# Altium integrated library Samtec_2_mm_Pitch_Socket_Strips.IntLib: 251 symbols (part 1 of 3)
Pins are listed as number, name and electrical type; pins without a type are passive.

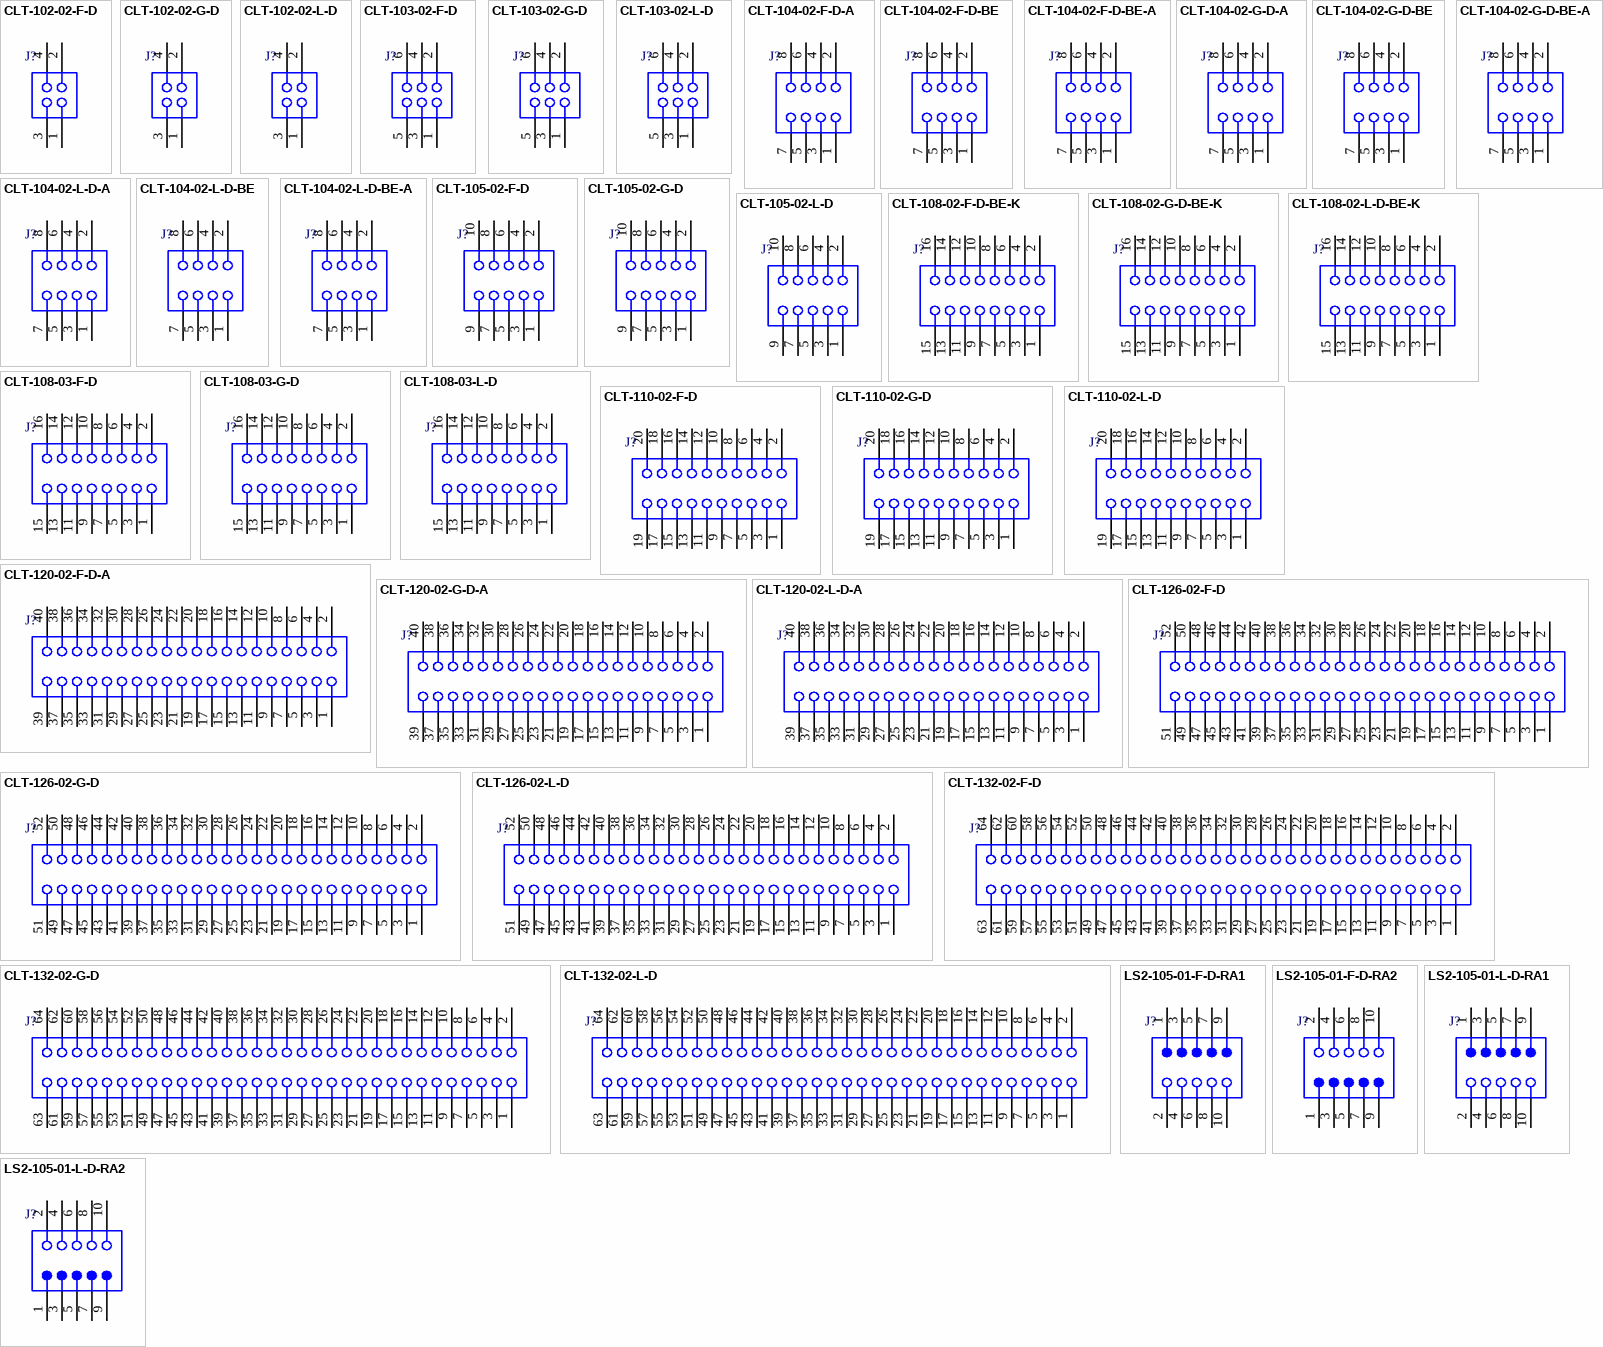
[diagram p0: symbols CLT-102-02-F-D to LS2-105-01-L-D-RA2]

## CLT-102-02-F-D
designator J?
Low Profile Dual Wipe Socket, Surface Mount, Vertical, -55 to 125 degC, 2 mm Pitch, 4-Pin, Female, RoHS; Manufacturer: Samtec; PartNumber: CLT-102-02-F-D; Pitch: 2 mm; DatasheetVersion: F-214; PackageVersion: CA, 10/1994; PackageReference: CLT-102-02-X-D; PackageDescription: 2mm Low Profile Socket Strip; Supplier 1: Newark; Supplier Part Number 1: 87P9552; Orientation: Vertical; RoHS: True; Temperature Range: -55 to 125 degC; Mounting Technology: Surface Mount; ComponentLink1Description: Manufacturer URL; ComponentLink1URL: http://www.samtec.com; ComponentLink2Description: Datasheet; ComponentLink2URL: http://www.samtec.com/documents/webfiles/pdf/CLT.PDF; ComponentLink3Description: Package Specification; ComponentLink3URL: http://www.samtec.com/documents/webfiles/cpdf/CLT-1XX-02-XX-D-XX-MKT.pdf
footprint SMTC-CLT-102-02-X-D (Low Profile Socket Strip, 2x2 Pins, Vertical, 2mm Pitch, Female)
pins: 1, 2, 3, 4

## CLT-102-02-G-D
designator J?
Low Profile Dual Wipe Socket, Surface Mount, Vertical, -55 to 125 degC, 2 mm Pitch, 4-Pin, Female, RoHS; Manufacturer: Samtec; PartNumber: CLT-102-02-G-D; Pitch: 2 mm; DatasheetVersion: F-214; PackageVersion: CA, 10/1994; PackageReference: CLT-102-02-X-D; PackageDescription: 2mm Low Profile Socket Strip; Supplier 1: Digi-Key; Supplier Part Number 1: SAM1165-02-ND; Orientation: Vertical; RoHS: True; Temperature Range: -55 to 125 degC; Mounting Technology: Surface Mount; ComponentLink1Description: Manufacturer URL; ComponentLink1URL: http://www.samtec.com; ComponentLink2Description: Datasheet; ComponentLink2URL: http://www.samtec.com/documents/webfiles/pdf/CLT.PDF; ComponentLink3Description: Package Specification; ComponentLink3URL: http://www.samtec.com/documents/webfiles/cpdf/CLT-1XX-02-XX-D-XX-MKT.pdf
footprint SMTC-CLT-102-02-X-D (Low Profile Socket Strip, 2x2 Pins, Vertical, 2mm Pitch, Female)
pins: 1, 2, 3, 4

## CLT-102-02-L-D
designator J?
Low Profile Dual Wipe Socket, Surface Mount, Vertical, -55 to 125 degC, 2 mm Pitch, 4-Pin, Female, RoHS; Manufacturer: Samtec; PartNumber: CLT-102-02-L-D; Pitch: 2 mm; DatasheetVersion: F-214; PackageVersion: CA, 10/1994; PackageReference: CLT-102-02-X-D; PackageDescription: 2mm Low Profile Socket Strip; Supplier 1: Digi-Key; Supplier Part Number 1: SAM1166-02-ND; Supplier 2: Newark; Supplier Part Number 2: 11P3945; Orientation: Vertical; RoHS: True; Temperature Range: -55 to 125 degC; Mounting Technology: Surface Mount; ComponentLink1Description: Manufacturer URL; ComponentLink1URL: http://www.samtec.com; ComponentLink2Description: Datasheet; ComponentLink2URL: http://www.samtec.com/documents/webfiles/pdf/CLT.PDF; ComponentLink3Description: Package Specification; ComponentLink3URL: http://www.samtec.com/documents/webfiles/cpdf/CLT-1XX-02-XX-D-XX-MKT.pdf
footprint SMTC-CLT-102-02-X-D (Low Profile Socket Strip, 2x2 Pins, Vertical, 2mm Pitch, Female)
pins: 1, 2, 3, 4

## CLT-103-02-F-D
designator J?
Low Profile Dual Wipe Socket, Surface Mount, Vertical, -55 to 125 degC, 2 mm Pitch, 6-Pin, Female, RoHS; Manufacturer: Samtec; PartNumber: CLT-103-02-F-D; Pitch: 2 mm; DatasheetVersion: F-214; PackageVersion: CA, 10/1994; PackageReference: CLT-103-02-X-D; PackageDescription: 2mm Low Profile Socket Strip; Supplier 1: Newark; Supplier Part Number 1: 87P9581; Orientation: Vertical; RoHS: True; Temperature Range: -55 to 125 degC; Mounting Technology: Surface Mount; ComponentLink1Description: Manufacturer URL; ComponentLink1URL: http://www.samtec.com; ComponentLink2Description: Datasheet; ComponentLink2URL: http://www.samtec.com/documents/webfiles/pdf/CLT.PDF; ComponentLink3Description: Package Specification; ComponentLink3URL: http://www.samtec.com/documents/webfiles/cpdf/CLT-1XX-02-XX-D-XX-MKT.pdf
footprint SMTC-CLT-103-02-X-D (Low Profile Socket Strip, 2x3 Pins, Vertical, 2mm Pitch, Female)
pins: 1, 2, 3, 4, 5, 6

## CLT-103-02-G-D
designator J?
Low Profile Dual Wipe Socket, Surface Mount, Vertical, -55 to 125 degC, 2 mm Pitch, 6-Pin, Female, RoHS; Manufacturer: Samtec; PartNumber: CLT-103-02-G-D; Pitch: 2 mm; DatasheetVersion: F-214; PackageVersion: CA, 10/1994; PackageReference: CLT-103-02-X-D; PackageDescription: 2mm Low Profile Socket Strip; Supplier 1: Digi-Key; Supplier Part Number 1: SAM1165-03-ND; Supplier 2: Newark; Supplier Part Number 2: 11P3948; Orientation: Vertical; RoHS: True; Temperature Range: -55 to 125 degC; Mounting Technology: Surface Mount; ComponentLink1Description: Manufacturer URL; ComponentLink1URL: http://www.samtec.com; ComponentLink2Description: Datasheet; ComponentLink2URL: http://www.samtec.com/documents/webfiles/pdf/CLT.PDF; ComponentLink3Description: Package Specification; ComponentLink3URL: http://www.samtec.com/documents/webfiles/cpdf/CLT-1XX-02-XX-D-XX-MKT.pdf
footprint SMTC-CLT-103-02-X-D (Low Profile Socket Strip, 2x3 Pins, Vertical, 2mm Pitch, Female)
pins: 1, 2, 3, 4, 5, 6

## CLT-103-02-L-D
designator J?
Low Profile Dual Wipe Socket, Surface Mount, Vertical, -55 to 125 degC, 2 mm Pitch, 6-Pin, Female, RoHS; Manufacturer: Samtec; PartNumber: CLT-103-02-L-D; Pitch: 2 mm; DatasheetVersion: F-214; PackageVersion: CA, 10/1994; PackageReference: CLT-103-02-X-D; PackageDescription: 2mm Low Profile Socket Strip; Supplier 1: Digi-Key; Supplier Part Number 1: SAM1166-03-ND; Supplier 2: Newark; Supplier Part Number 2: 11P3949; Orientation: Vertical; RoHS: True; Temperature Range: -55 to 125 degC; Mounting Technology: Surface Mount; ComponentLink1Description: Manufacturer URL; ComponentLink1URL: http://www.samtec.com; ComponentLink2Description: Datasheet; ComponentLink2URL: http://www.samtec.com/documents/webfiles/pdf/CLT.PDF; ComponentLink3Description: Package Specification; ComponentLink3URL: http://www.samtec.com/documents/webfiles/cpdf/CLT-1XX-02-XX-D-XX-MKT.pdf
footprint SMTC-CLT-103-02-X-D (Low Profile Socket Strip, 2x3 Pins, Vertical, 2mm Pitch, Female)
pins: 1, 2, 3, 4, 5, 6

## CLT-104-02-F-D-A
designator J?
Low Profile Dual Wipe Socket, Surface Mount, Vertical, -55 to 125 degC, 2 mm Pitch, 8-Pin, Female, RoHS; Manufacturer: Samtec; PartNumber: CLT-104-02-F-D-A; Pitch: 2 mm; DatasheetVersion: F-214; PackageVersion: CA, 10/1994; PackageReference: CLT-104-02-X-D-A; PackageDescription: 2mm Low Profile Socket Strip; Supplier 1: Newark; Supplier Part Number 1: 87P9633; Orientation: Vertical; RoHS: True; Temperature Range: -55 to 125 degC; Mounting Technology: Surface Mount; ComponentLink1Description: Manufacturer URL; ComponentLink1URL: http://www.samtec.com; ComponentLink2Description: Datasheet; ComponentLink2URL: http://www.samtec.com/documents/webfiles/pdf/CLT.PDF; ComponentLink3Description: Package Specification; ComponentLink3URL: http://www.samtec.com/documents/webfiles/cpdf/CLT-1XX-02-XX-D-XX-MKT.pdf
footprint SMTC-CLT-104-02-X-D-A (Low Profile Socket Strip, 2x4 Pins, Vertical, 2mm Pitch, Female)
pins: 1, 2, 3, 4, 5, 6, 7, 8

## CLT-104-02-F-D-BE
designator J?
Low Profile Dual Wipe Socket, Surface Mount, Vertical, -55 to 125 degC, 2 mm Pitch, 8-Pin, Female, RoHS; Manufacturer: Samtec; PartNumber: CLT-104-02-F-D-BE; Pitch: 2 mm; DatasheetVersion: F-214; PackageVersion: CA, 10/1994; PackageReference: CLT-104-02-X-D-BE; PackageDescription: 2mm Low Profile Socket Strip; Supplier 1: Newark; Supplier Part Number 1: 87P9639; Orientation: Vertical; RoHS: True; Temperature Range: -55 to 125 degC; Mounting Technology: Surface Mount; ComponentLink1Description: Manufacturer URL; ComponentLink1URL: http://www.samtec.com; ComponentLink2Description: Datasheet; ComponentLink2URL: http://www.samtec.com/documents/webfiles/pdf/CLT.PDF; ComponentLink3Description: Package Specification; ComponentLink3URL: http://www.samtec.com/documents/webfiles/cpdf/CLT-1XX-02-XX-D-XX-MKT.pdf
footprint SMTC-CLT-104-02-X-D-BE (Low Profile Socket Strip, 2x4 Pins, Vertical, 2mm Pitch, Female)
pins: 1, 2, 3, 4, 5, 6, 7, 8

## CLT-104-02-F-D-BE-A
designator J?
Low Profile Dual Wipe Socket, Surface Mount, Vertical, -55 to 125 degC, 2 mm Pitch, 8-Pin, Female, RoHS; Manufacturer: Samtec; PartNumber: CLT-104-02-F-D-BE-A; Pitch: 2 mm; DatasheetVersion: F-214; PackageVersion: CA, 10/1994; PackageReference: CLT-104-02-X-D-BE-A; PackageDescription: 2mm Low Profile Socket Strip; Orientation: Vertical; RoHS: True; Temperature Range: -55 to 125 degC; Mounting Technology: Surface Mount; ComponentLink1Description: Manufacturer URL; ComponentLink1URL: http://www.samtec.com; ComponentLink2Description: Datasheet; ComponentLink2URL: http://www.samtec.com/documents/webfiles/pdf/CLT.PDF; ComponentLink3Description: Package Specification; ComponentLink3URL: http://www.samtec.com/documents/webfiles/cpdf/CLT-1XX-02-XX-D-XX-MKT.pdf
footprint SMTC-CLT-104-02-X-D-BE-A (Low Profile Socket Strip, 2x4 Pins, Vertical, 2mm Pitch, Female)
pins: 1, 2, 3, 4, 5, 6, 7, 8

## CLT-104-02-G-D-A
designator J?
Low Profile Dual Wipe Socket, Surface Mount, Vertical, -55 to 125 degC, 2 mm Pitch, 8-Pin, Female, RoHS; Manufacturer: Samtec; PartNumber: CLT-104-02-G-D-A; Pitch: 2 mm; DatasheetVersion: F-214; PackageVersion: CA, 10/1994; PackageReference: CLT-104-02-X-D-A; PackageDescription: 2mm Low Profile Socket Strip; Orientation: Vertical; RoHS: True; Temperature Range: -55 to 125 degC; Mounting Technology: Surface Mount; ComponentLink1Description: Manufacturer URL; ComponentLink1URL: http://www.samtec.com; ComponentLink2Description: Datasheet; ComponentLink2URL: http://www.samtec.com/documents/webfiles/pdf/CLT.PDF; ComponentLink3Description: Package Specification; ComponentLink3URL: http://www.samtec.com/documents/webfiles/cpdf/CLT-1XX-02-XX-D-XX-MKT.pdf
footprint SMTC-CLT-104-02-X-D-A (Low Profile Socket Strip, 2x4 Pins, Vertical, 2mm Pitch, Female)
pins: 1, 2, 3, 4, 5, 6, 7, 8

## CLT-104-02-G-D-BE
designator J?
Low Profile Dual Wipe Socket, Surface Mount, Vertical, -55 to 125 degC, 2 mm Pitch, 8-Pin, Female, RoHS; Manufacturer: Samtec; PartNumber: CLT-104-02-G-D-BE; Pitch: 2 mm; DatasheetVersion: F-214; PackageVersion: CA, 10/1994; PackageReference: CLT-104-02-X-D-BE; PackageDescription: 2mm Low Profile Socket Strip; Supplier 1: Newark; Supplier Part Number 1: 87P9679; Orientation: Vertical; RoHS: True; Temperature Range: -55 to 125 degC; Mounting Technology: Surface Mount; ComponentLink1Description: Manufacturer URL; ComponentLink1URL: http://www.samtec.com; ComponentLink2Description: Datasheet; ComponentLink2URL: http://www.samtec.com/documents/webfiles/pdf/CLT.PDF; ComponentLink3Description: Package Specification; ComponentLink3URL: http://www.samtec.com/documents/webfiles/cpdf/CLT-1XX-02-XX-D-XX-MKT.pdf
footprint SMTC-CLT-104-02-X-D-BE (Low Profile Socket Strip, 2x4 Pins, Vertical, 2mm Pitch, Female)
pins: 1, 2, 3, 4, 5, 6, 7, 8

## CLT-104-02-G-D-BE-A
designator J?
Low Profile Dual Wipe Socket, Surface Mount, Vertical, -55 to 125 degC, 2 mm Pitch, 8-Pin, Female, RoHS; Manufacturer: Samtec; PartNumber: CLT-104-02-G-D-BE-A; Pitch: 2 mm; DatasheetVersion: F-214; PackageVersion: CA, 10/1994; PackageReference: CLT-104-02-X-D-BE-A; PackageDescription: 2mm Low Profile Socket Strip; Orientation: Vertical; RoHS: True; Temperature Range: -55 to 125 degC; Mounting Technology: Surface Mount; ComponentLink1Description: Manufacturer URL; ComponentLink1URL: http://www.samtec.com; ComponentLink2Description: Datasheet; ComponentLink2URL: http://www.samtec.com/documents/webfiles/pdf/CLT.PDF; ComponentLink3Description: Package Specification; ComponentLink3URL: http://www.samtec.com/documents/webfiles/cpdf/CLT-1XX-02-XX-D-XX-MKT.pdf
footprint SMTC-CLT-104-02-X-D-BE-A (Low Profile Socket Strip, 2x4 Pins, Vertical, 2mm Pitch, Female)
pins: 1, 2, 3, 4, 5, 6, 7, 8

## CLT-104-02-L-D-A
designator J?
Low Profile Dual Wipe Socket, Surface Mount, Vertical, -55 to 125 degC, 2 mm Pitch, 8-Pin, Female, RoHS; Manufacturer: Samtec; PartNumber: CLT-104-02-L-D-A; Pitch: 2 mm; DatasheetVersion: F-214; PackageVersion: CA, 10/1994; PackageReference: CLT-104-02-X-D-A; PackageDescription: 2mm Low Profile Socket Strip; Supplier 1: Newark; Supplier Part Number 1: 87P9698; Orientation: Vertical; RoHS: True; Temperature Range: -55 to 125 degC; Mounting Technology: Surface Mount; ComponentLink1Description: Manufacturer URL; ComponentLink1URL: http://www.samtec.com; ComponentLink2Description: Datasheet; ComponentLink2URL: http://www.samtec.com/documents/webfiles/pdf/CLT.PDF; ComponentLink3Description: Package Specification; ComponentLink3URL: http://www.samtec.com/documents/webfiles/cpdf/CLT-1XX-02-XX-D-XX-MKT.pdf
footprint SMTC-CLT-104-02-X-D-A (Low Profile Socket Strip, 2x4 Pins, Vertical, 2mm Pitch, Female)
pins: 1, 2, 3, 4, 5, 6, 7, 8

## CLT-104-02-L-D-BE
designator J?
Low Profile Dual Wipe Socket, Surface Mount, Vertical, -55 to 125 degC, 2 mm Pitch, 8-Pin, Female, RoHS; Manufacturer: Samtec; PartNumber: CLT-104-02-L-D-BE; Pitch: 2 mm; DatasheetVersion: F-214; PackageVersion: CA, 10/1994; PackageReference: CLT-104-02-X-D-BE; PackageDescription: 2mm Low Profile Socket Strip; Supplier 1: Newark; Supplier Part Number 1: 87P9705; Orientation: Vertical; RoHS: True; Temperature Range: -55 to 125 degC; Mounting Technology: Surface Mount; ComponentLink1Description: Manufacturer URL; ComponentLink1URL: http://www.samtec.com; ComponentLink2Description: Datasheet; ComponentLink2URL: http://www.samtec.com/documents/webfiles/pdf/CLT.PDF; ComponentLink3Description: Package Specification; ComponentLink3URL: http://www.samtec.com/documents/webfiles/cpdf/CLT-1XX-02-XX-D-XX-MKT.pdf
footprint SMTC-CLT-104-02-X-D-BE (Low Profile Socket Strip, 2x4 Pins, Vertical, 2mm Pitch, Female)
pins: 1, 2, 3, 4, 5, 6, 7, 8

## CLT-104-02-L-D-BE-A
designator J?
Low Profile Dual Wipe Socket, Surface Mount, Vertical, -55 to 125 degC, 2 mm Pitch, 8-Pin, Female, RoHS; Manufacturer: Samtec; PartNumber: CLT-104-02-L-D-BE-A; Pitch: 2 mm; DatasheetVersion: F-214; PackageVersion: CA, 10/1994; PackageReference: CLT-104-02-X-D-BE-A; PackageDescription: 2mm Low Profile Socket Strip; Orientation: Vertical; RoHS: True; Temperature Range: -55 to 125 degC; Mounting Technology: Surface Mount; ComponentLink1Description: Manufacturer URL; ComponentLink1URL: http://www.samtec.com; ComponentLink2Description: Datasheet; ComponentLink2URL: http://www.samtec.com/documents/webfiles/pdf/CLT.PDF; ComponentLink3Description: Package Specification; ComponentLink3URL: http://www.samtec.com/documents/webfiles/cpdf/CLT-1XX-02-XX-D-XX-MKT.pdf
footprint SMTC-CLT-104-02-X-D-BE-A (Low Profile Socket Strip, 2x4 Pins, Vertical, 2mm Pitch, Female)
pins: 1, 2, 3, 4, 5, 6, 7, 8

## CLT-105-02-F-D
designator J?
Low Profile Dual Wipe Socket, Surface Mount, Vertical, -55 to 125 degC, 2 mm Pitch, 10-Pin, Female, RoHS; Manufacturer: Samtec; PartNumber: CLT-105-02-F-D; Pitch: 2 mm; DatasheetVersion: F-214; PackageVersion: CA, 10/1994; PackageReference: CLT-105-02-X-D; PackageDescription: 2mm Low Profile Socket Strip; Supplier 1: Newark; Supplier Part Number 1: 87P9758; Orientation: Vertical; RoHS: True; Temperature Range: -55 to 125 degC; Mounting Technology: Surface Mount; ComponentLink1Description: Manufacturer URL; ComponentLink1URL: http://www.samtec.com; ComponentLink2Description: Datasheet; ComponentLink2URL: http://www.samtec.com/documents/webfiles/pdf/CLT.PDF; ComponentLink3Description: Package Specification; ComponentLink3URL: http://www.samtec.com/documents/webfiles/cpdf/CLT-1XX-02-XX-D-XX-MKT.pdf
footprint SMTC-CLT-105-02-X-D (Low Profile Socket Strip, 2x5 Pins, Vertical, 2mm Pitch, Female)
pins: 1, 2, 3, 4, 5, 6, 7, 8, 9, 10

## CLT-105-02-G-D
designator J?
Low Profile Dual Wipe Socket, Surface Mount, Vertical, -55 to 125 degC, 2 mm Pitch, 10-Pin, Female, RoHS; Manufacturer: Samtec; PartNumber: CLT-105-02-G-D; Pitch: 2 mm; DatasheetVersion: F-214; PackageVersion: CA, 10/1994; PackageReference: CLT-105-02-X-D; PackageDescription: 2mm Low Profile Socket Strip; Supplier 1: Digi-Key; Supplier Part Number 1: SAM1165-05-ND; Supplier 2: Newark; Supplier Part Number 2: 11P3956; Orientation: Vertical; RoHS: True; Temperature Range: -55 to 125 degC; Mounting Technology: Surface Mount; ComponentLink1Description: Manufacturer URL; ComponentLink1URL: http://www.samtec.com; ComponentLink2Description: Datasheet; ComponentLink2URL: http://www.samtec.com/documents/webfiles/pdf/CLT.PDF; ComponentLink3Description: Package Specification; ComponentLink3URL: http://www.samtec.com/documents/webfiles/cpdf/CLT-1XX-02-XX-D-XX-MKT.pdf
footprint SMTC-CLT-105-02-X-D (Low Profile Socket Strip, 2x5 Pins, Vertical, 2mm Pitch, Female)
pins: 1, 2, 3, 4, 5, 6, 7, 8, 9, 10

## CLT-105-02-L-D
designator J?
Low Profile Dual Wipe Socket, Surface Mount, Vertical, -55 to 125 degC, 2 mm Pitch, 10-Pin, Female, RoHS; Manufacturer: Samtec; PartNumber: CLT-105-02-L-D; Pitch: 2 mm; DatasheetVersion: F-214; PackageVersion: CA, 10/1994; PackageReference: CLT-105-02-X-D; PackageDescription: 2mm Low Profile Socket Strip; Supplier 1: Digi-Key; Supplier Part Number 1: SAM1166-05-ND; Supplier 2: Farnell; Supplier Part Number 2: 1667571; Supplier 3: Newark; Supplier Part Number 3: 15P1351; Supplier 4: Newark; Supplier Part Number 4: 11P3957; Orientation: Vertical; RoHS: True; Temperature Range: -55 to 125 degC; Mounting Technology: Surface Mount; ComponentLink1Description: Manufacturer URL; ComponentLink1URL: http://www.samtec.com; ComponentLink2Description: Datasheet; ComponentLink2URL: http://www.samtec.com/documents/webfiles/pdf/CLT.PDF; ComponentLink3Description: Package Specification; ComponentLink3URL: http://www.samtec.com/documents/webfiles/cpdf/CLT-1XX-02-XX-D-XX-MKT.pdf
footprint SMTC-CLT-105-02-X-D (Low Profile Socket Strip, 2x5 Pins, Vertical, 2mm Pitch, Female)
pins: 1, 2, 3, 4, 5, 6, 7, 8, 9, 10

## CLT-108-02-F-D-BE-K
designator J?
Low Profile Dual Wipe Socket, Surface Mount, Vertical, -55 to 125 degC, 2 mm Pitch, 16-Pin, Female, RoHS; Manufacturer: Samtec; PartNumber: CLT-108-02-F-D-BE-K; Pitch: 2 mm; DatasheetVersion: F-214; PackageVersion: CA, 10/1994; PackageReference: CLT-108-02-X-D-BE-K; PackageDescription: 2mm Low Profile Socket Strip; Orientation: Vertical; RoHS: True; Temperature Range: -55 to 125 degC; Mounting Technology: Surface Mount; ComponentLink1Description: Manufacturer URL; ComponentLink1URL: http://www.samtec.com; ComponentLink2Description: Datasheet; ComponentLink2URL: http://www.samtec.com/documents/webfiles/pdf/CLT.PDF; ComponentLink3Description: Package Specification; ComponentLink3URL: http://www.samtec.com/documents/webfiles/cpdf/CLT-1XX-02-XX-D-XX-MKT.pdf
footprint SMTC-CLT-108-02-X-D-BE-K (Low Profile Socket Strip, 2x8 Pins, Vertical, 2mm Pitch, Female)
pins: 1, 2, 3, 4, 5, 6, 7, 8, 9, 10, 11, 12, 13, 14, 15, 16

## CLT-108-02-G-D-BE-K
designator J?
Low Profile Dual Wipe Socket, Surface Mount, Vertical, -55 to 125 degC, 2 mm Pitch, 16-Pin, Female, RoHS; Manufacturer: Samtec; PartNumber: CLT-108-02-G-D-BE-K; Pitch: 2 mm; DatasheetVersion: F-214; PackageVersion: CA, 10/1994; PackageReference: CLT-108-02-X-D-BE-K; PackageDescription: 2mm Low Profile Socket Strip; Orientation: Vertical; RoHS: True; Temperature Range: -55 to 125 degC; Mounting Technology: Surface Mount; ComponentLink1Description: Manufacturer URL; ComponentLink1URL: http://www.samtec.com; ComponentLink2Description: Datasheet; ComponentLink2URL: http://www.samtec.com/documents/webfiles/pdf/CLT.PDF; ComponentLink3Description: Package Specification; ComponentLink3URL: http://www.samtec.com/documents/webfiles/cpdf/CLT-1XX-02-XX-D-XX-MKT.pdf
footprint SMTC-CLT-108-02-X-D-BE-K (Low Profile Socket Strip, 2x8 Pins, Vertical, 2mm Pitch, Female)
pins: 1, 2, 3, 4, 5, 6, 7, 8, 9, 10, 11, 12, 13, 14, 15, 16

## CLT-108-02-L-D-BE-K
designator J?
Low Profile Dual Wipe Socket, Surface Mount, Vertical, -55 to 125 degC, 2 mm Pitch, 16-Pin, Female, RoHS; Manufacturer: Samtec; PartNumber: CLT-108-02-L-D-BE-K; Pitch: 2 mm; DatasheetVersion: F-214; PackageVersion: CA, 10/1994; PackageReference: CLT-108-02-X-D-BE-K; PackageDescription: 2mm Low Profile Socket Strip; Orientation: Vertical; RoHS: True; Temperature Range: -55 to 125 degC; Mounting Technology: Surface Mount; ComponentLink1Description: Manufacturer URL; ComponentLink1URL: http://www.samtec.com; ComponentLink2Description: Datasheet; ComponentLink2URL: http://www.samtec.com/documents/webfiles/pdf/CLT.PDF; ComponentLink3Description: Package Specification; ComponentLink3URL: http://www.samtec.com/documents/webfiles/cpdf/CLT-1XX-02-XX-D-XX-MKT.pdf
footprint SMTC-CLT-108-02-X-D-BE-K (Low Profile Socket Strip, 2x8 Pins, Vertical, 2mm Pitch, Female)
pins: 1, 2, 3, 4, 5, 6, 7, 8, 9, 10, 11, 12, 13, 14, 15, 16

## CLT-108-03-F-D
designator J?
Low Profile Dual Wipe Socket, Through-hole, Vertical, -55 to 125 degC, 2 mm Pitch, 16-Pin, Female, RoHS; Manufacturer: Samtec; PartNumber: CLT-108-03-F-D; Pitch: 2 mm; DatasheetVersion: F-214; PackageVersion: X, 11/1995; PackageReference: CLT-108-03-X-D; PackageDescription: 2mm Low Profile Socket Strip; Orientation: Vertical; RoHS: True; Temperature Range: -55 to 125 degC; Mounting Technology: Through-hole; ComponentLink1Description: Manufacturer URL; ComponentLink1URL: http://www.samtec.com; ComponentLink2Description: Datasheet; ComponentLink2URL: http://www.samtec.com/documents/webfiles/pdf/CLT.PDF; ComponentLink3Description: Package Specification; ComponentLink3URL: http://www.samtec.com/documents/webfiles/cpdf/CLT-1XX-XX-XX-D-MKT.pdf
footprint SMTC-CLT-108-03-X-D (Low Profile Socket Strip, 2x8 Pins, Vertical, 2mm Pitch, Female)
pins: 1, 2, 3, 4, 5, 6, 7, 8, 9, 10, 11, 12, 13, 14, 15, 16

## CLT-108-03-G-D
designator J?
Low Profile Dual Wipe Socket, Through-hole, Vertical, -55 to 125 degC, 2 mm Pitch, 16-Pin, Female, RoHS; Manufacturer: Samtec; PartNumber: CLT-108-03-G-D; Pitch: 2 mm; DatasheetVersion: F-214; PackageVersion: X, 11/1995; PackageReference: CLT-108-03-X-D; PackageDescription: 2mm Low Profile Socket Strip; Orientation: Vertical; RoHS: True; Temperature Range: -55 to 125 degC; Mounting Technology: Through-hole; ComponentLink1Description: Manufacturer URL; ComponentLink1URL: http://www.samtec.com; ComponentLink2Description: Datasheet; ComponentLink2URL: http://www.samtec.com/documents/webfiles/pdf/CLT.PDF; ComponentLink3Description: Package Specification; ComponentLink3URL: http://www.samtec.com/documents/webfiles/cpdf/CLT-1XX-XX-XX-D-MKT.pdf
footprint SMTC-CLT-108-03-X-D (Low Profile Socket Strip, 2x8 Pins, Vertical, 2mm Pitch, Female)
pins: 1, 2, 3, 4, 5, 6, 7, 8, 9, 10, 11, 12, 13, 14, 15, 16

## CLT-108-03-L-D
designator J?
Low Profile Dual Wipe Socket, Through-hole, Vertical, -55 to 125 degC, 2 mm Pitch, 16-Pin, Female, RoHS; Manufacturer: Samtec; PartNumber: CLT-108-03-L-D; Pitch: 2 mm; DatasheetVersion: F-214; PackageVersion: X, 11/1995; PackageReference: CLT-108-03-X-D; PackageDescription: 2mm Low Profile Socket Strip; Orientation: Vertical; RoHS: True; Temperature Range: -55 to 125 degC; Mounting Technology: Through-hole; ComponentLink1Description: Manufacturer URL; ComponentLink1URL: http://www.samtec.com; ComponentLink2Description: Datasheet; ComponentLink2URL: http://www.samtec.com/documents/webfiles/pdf/CLT.PDF; ComponentLink3Description: Package Specification; ComponentLink3URL: http://www.samtec.com/documents/webfiles/cpdf/CLT-1XX-XX-XX-D-MKT.pdf
footprint SMTC-CLT-108-03-X-D (Low Profile Socket Strip, 2x8 Pins, Vertical, 2mm Pitch, Female)
pins: 1, 2, 3, 4, 5, 6, 7, 8, 9, 10, 11, 12, 13, 14, 15, 16

## CLT-110-02-F-D
designator J?
Low Profile Dual Wipe Socket, Surface Mount, Vertical, -55 to 125 degC, 2 mm Pitch, 20-Pin, Female, RoHS; Manufacturer: Samtec; PartNumber: CLT-110-02-F-D; Pitch: 2 mm; DatasheetVersion: F-214; PackageVersion: CA, 10/1994; PackageReference: CLT-110-02-X-D; PackageDescription: 2mm Low Profile Socket Strip; Supplier 1: Newark; Supplier Part Number 1: 34P2733; Orientation: Vertical; RoHS: True; Temperature Range: -55 to 125 degC; Mounting Technology: Surface Mount; ComponentLink1Description: Manufacturer URL; ComponentLink1URL: http://www.samtec.com; ComponentLink2Description: Datasheet; ComponentLink2URL: http://www.samtec.com/documents/webfiles/pdf/CLT.PDF; ComponentLink3Description: Package Specification; ComponentLink3URL: http://www.samtec.com/documents/webfiles/cpdf/CLT-1XX-02-XX-D-XX-MKT.pdf
footprint SMTC-CLT-110-02-X-D (Low Profile Socket Strip, 2x10 Pins, Vertical, 2mm Pitch, Female)
pins: 1, 2, 3, 4, 5, 6, 7, 8, 9, 10, 11, 12, 13, 14, 15, 16, 17, 18, 19, 20

## CLT-110-02-G-D
designator J?
Low Profile Dual Wipe Socket, Surface Mount, Vertical, -55 to 125 degC, 2 mm Pitch, 20-Pin, Female, RoHS; Manufacturer: Samtec; PartNumber: CLT-110-02-G-D; Pitch: 2 mm; DatasheetVersion: F-214; PackageVersion: CA, 10/1994; PackageReference: CLT-110-02-X-D; PackageDescription: 2mm Low Profile Socket Strip; Supplier 1: Digi-Key; Supplier Part Number 1: SAM1165-10-ND; Supplier 2: Newark; Supplier Part Number 2: 11P3975; Orientation: Vertical; RoHS: True; Temperature Range: -55 to 125 degC; Mounting Technology: Surface Mount; ComponentLink1Description: Manufacturer URL; ComponentLink1URL: http://www.samtec.com; ComponentLink2Description: Datasheet; ComponentLink2URL: http://www.samtec.com/documents/webfiles/pdf/CLT.PDF; ComponentLink3Description: Package Specification; ComponentLink3URL: http://www.samtec.com/documents/webfiles/cpdf/CLT-1XX-02-XX-D-XX-MKT.pdf
footprint SMTC-CLT-110-02-X-D (Low Profile Socket Strip, 2x10 Pins, Vertical, 2mm Pitch, Female)
pins: 1, 2, 3, 4, 5, 6, 7, 8, 9, 10, 11, 12, 13, 14, 15, 16, 17, 18, 19, 20

## CLT-110-02-L-D
designator J?
Low Profile Dual Wipe Socket, Surface Mount, Vertical, -55 to 125 degC, 2 mm Pitch, 20-Pin, Female, RoHS; Manufacturer: Samtec; PartNumber: CLT-110-02-L-D; Pitch: 2 mm; DatasheetVersion: F-214; PackageVersion: CA, 10/1994; PackageReference: CLT-110-02-X-D; PackageDescription: 2mm Low Profile Socket Strip; Supplier 1: Digi-Key; Supplier Part Number 1: SAM1166-10-ND; Supplier 2: Farnell; Supplier Part Number 2: 1667573; Supplier 3: Newark; Supplier Part Number 3: 11P3976; Orientation: Vertical; RoHS: True; Temperature Range: -55 to 125 degC; Mounting Technology: Surface Mount; ComponentLink1Description: Manufacturer URL; ComponentLink1URL: http://www.samtec.com; ComponentLink2Description: Datasheet; ComponentLink2URL: http://www.samtec.com/documents/webfiles/pdf/CLT.PDF; ComponentLink3Description: Package Specification; ComponentLink3URL: http://www.samtec.com/documents/webfiles/cpdf/CLT-1XX-02-XX-D-XX-MKT.pdf
footprint SMTC-CLT-110-02-X-D (Low Profile Socket Strip, 2x10 Pins, Vertical, 2mm Pitch, Female)
pins: 1, 2, 3, 4, 5, 6, 7, 8, 9, 10, 11, 12, 13, 14, 15, 16, 17, 18, 19, 20

## CLT-120-02-F-D-A
designator J?
Low Profile Dual Wipe Socket, Surface Mount, Vertical, -55 to 125 degC, 2 mm Pitch, 40-Pin, Female, RoHS; Manufacturer: Samtec; PartNumber: CLT-120-02-F-D-A; Pitch: 2 mm; DatasheetVersion: F-214; PackageVersion: CA, 10/1994; PackageReference: CLT-120-02-X-D-A; PackageDescription: 2mm Low Profile Socket Strip; Orientation: Vertical; RoHS: True; Temperature Range: -55 to 125 degC; Mounting Technology: Surface Mount; ComponentLink1Description: Manufacturer URL; ComponentLink1URL: http://www.samtec.com; ComponentLink2Description: Datasheet; ComponentLink2URL: http://www.samtec.com/documents/webfiles/pdf/CLT.PDF; ComponentLink3Description: Package Specification; ComponentLink3URL: http://www.samtec.com/documents/webfiles/cpdf/CLT-1XX-02-XX-D-XX-MKT.pdf
footprint SMTC-CLT-120-02-X-D-A (Low Profile Socket Strip, 2x20 Pins, Vertical, 2mm Pitch, Female)
pins: 1, 2, 3, 4, 5, 6, 7, 8, 9, 10, 11, 12, 13, 14, 15, 16, 17, 18, 19, 20, 21, 22, 23, 24, 25, 26, 27, 28, 29, 30, 31, 32, 33, 34, 35, 36, 37, 38, 39, 40

## CLT-120-02-G-D-A
designator J?
Low Profile Dual Wipe Socket, Surface Mount, Vertical, -55 to 125 degC, 2 mm Pitch, 40-Pin, Female, RoHS; Manufacturer: Samtec; PartNumber: CLT-120-02-G-D-A; Pitch: 2 mm; DatasheetVersion: F-214; PackageVersion: CA, 10/1994; PackageReference: CLT-120-02-X-D-A; PackageDescription: 2mm Low Profile Socket Strip; Supplier 1: Newark; Supplier Part Number 1: 88P1211; Orientation: Vertical; RoHS: True; Temperature Range: -55 to 125 degC; Mounting Technology: Surface Mount; ComponentLink1Description: Manufacturer URL; ComponentLink1URL: http://www.samtec.com; ComponentLink2Description: Datasheet; ComponentLink2URL: http://www.samtec.com/documents/webfiles/pdf/CLT.PDF; ComponentLink3Description: Package Specification; ComponentLink3URL: http://www.samtec.com/documents/webfiles/cpdf/CLT-1XX-02-XX-D-XX-MKT.pdf
footprint SMTC-CLT-120-02-X-D-A (Low Profile Socket Strip, 2x20 Pins, Vertical, 2mm Pitch, Female)
pins: 1, 2, 3, 4, 5, 6, 7, 8, 9, 10, 11, 12, 13, 14, 15, 16, 17, 18, 19, 20, 21, 22, 23, 24, 25, 26, 27, 28, 29, 30, 31, 32, 33, 34, 35, 36, 37, 38, 39, 40

## CLT-120-02-L-D-A
designator J?
Low Profile Dual Wipe Socket, Surface Mount, Vertical, -55 to 125 degC, 2 mm Pitch, 40-Pin, Female, RoHS; Manufacturer: Samtec; PartNumber: CLT-120-02-L-D-A; Pitch: 2 mm; DatasheetVersion: F-214; PackageVersion: CA, 10/1994; PackageReference: CLT-120-02-X-D-A; PackageDescription: 2mm Low Profile Socket Strip; Supplier 1: Newark; Supplier Part Number 1: 88P1239; Orientation: Vertical; RoHS: True; Temperature Range: -55 to 125 degC; Mounting Technology: Surface Mount; ComponentLink1Description: Manufacturer URL; ComponentLink1URL: http://www.samtec.com; ComponentLink2Description: Datasheet; ComponentLink2URL: http://www.samtec.com/documents/webfiles/pdf/CLT.PDF; ComponentLink3Description: Package Specification; ComponentLink3URL: http://www.samtec.com/documents/webfiles/cpdf/CLT-1XX-02-XX-D-XX-MKT.pdf
footprint SMTC-CLT-120-02-X-D-A (Low Profile Socket Strip, 2x20 Pins, Vertical, 2mm Pitch, Female)
pins: 1, 2, 3, 4, 5, 6, 7, 8, 9, 10, 11, 12, 13, 14, 15, 16, 17, 18, 19, 20, 21, 22, 23, 24, 25, 26, 27, 28, 29, 30, 31, 32, 33, 34, 35, 36, 37, 38, 39, 40

## CLT-126-02-F-D
designator J?
Low Profile Dual Wipe Socket, Surface Mount, Vertical, -55 to 125 degC, 2 mm Pitch, 52-Pin, Female, RoHS; Manufacturer: Samtec; PartNumber: CLT-126-02-F-D; Pitch: 2 mm; DatasheetVersion: F-214; PackageVersion: CA, 10/1994; PackageReference: CLT-126-02-X-D; PackageDescription: 2mm Low Profile Socket Strip; Orientation: Vertical; RoHS: True; Temperature Range: -55 to 125 degC; Mounting Technology: Surface Mount; ComponentLink1Description: Manufacturer URL; ComponentLink1URL: http://www.samtec.com; ComponentLink2Description: Datasheet; ComponentLink2URL: http://www.samtec.com/documents/webfiles/pdf/CLT.PDF; ComponentLink3Description: Package Specification; ComponentLink3URL: http://www.samtec.com/documents/webfiles/cpdf/CLT-1XX-02-XX-D-XX-MKT.pdf
footprint SMTC-CLT-126-02-X-D (Low Profile Socket Strip, 2x26 Pins, Vertical, 2mm Pitch, Female)
pins: 1, 2, 3, 4, 5, 6, 7, 8, 9, 10, 11, 12, 13, 14, 15, 16, 17, 18, 19, 20, 21, 22, 23, 24, 25, 26, 27, 28, 29, 30, 31, 32, 33, 34, 35, 36, 37, 38, 39, 40, 41, 42, 43, 44, 45, 46, 47, 48, 49, 50, 51, 52

## CLT-126-02-G-D
designator J?
Low Profile Dual Wipe Socket, Surface Mount, Vertical, -55 to 125 degC, 2 mm Pitch, 52-Pin, Female, RoHS; Manufacturer: Samtec; PartNumber: CLT-126-02-G-D; Pitch: 2 mm; DatasheetVersion: F-214; PackageVersion: CA, 10/1994; PackageReference: CLT-126-02-X-D; PackageDescription: 2mm Low Profile Socket Strip; Supplier 1: Digi-Key; Supplier Part Number 1: SAM1165-26-ND; Orientation: Vertical; RoHS: True; Temperature Range: -55 to 125 degC; Mounting Technology: Surface Mount; ComponentLink1Description: Manufacturer URL; ComponentLink1URL: http://www.samtec.com; ComponentLink2Description: Datasheet; ComponentLink2URL: http://www.samtec.com/documents/webfiles/pdf/CLT.PDF; ComponentLink3Description: Package Specification; ComponentLink3URL: http://www.samtec.com/documents/webfiles/cpdf/CLT-1XX-02-XX-D-XX-MKT.pdf
footprint SMTC-CLT-126-02-X-D (Low Profile Socket Strip, 2x26 Pins, Vertical, 2mm Pitch, Female)
pins: 1, 2, 3, 4, 5, 6, 7, 8, 9, 10, 11, 12, 13, 14, 15, 16, 17, 18, 19, 20, 21, 22, 23, 24, 25, 26, 27, 28, 29, 30, 31, 32, 33, 34, 35, 36, 37, 38, 39, 40, 41, 42, 43, 44, 45, 46, 47, 48, 49, 50, 51, 52

## CLT-126-02-L-D
designator J?
Low Profile Dual Wipe Socket, Surface Mount, Vertical, -55 to 125 degC, 2 mm Pitch, 52-Pin, Female, RoHS; Manufacturer: Samtec; PartNumber: CLT-126-02-L-D; Pitch: 2 mm; DatasheetVersion: F-214; PackageVersion: CA, 10/1994; PackageReference: CLT-126-02-X-D; PackageDescription: 2mm Low Profile Socket Strip; Supplier 1: Digi-Key; Supplier Part Number 1: SAM1166-26-ND; Supplier 2: Newark; Supplier Part Number 2: 11P4040; Orientation: Vertical; RoHS: True; Temperature Range: -55 to 125 degC; Mounting Technology: Surface Mount; ComponentLink1Description: Manufacturer URL; ComponentLink1URL: http://www.samtec.com; ComponentLink2Description: Datasheet; ComponentLink2URL: http://www.samtec.com/documents/webfiles/pdf/CLT.PDF; ComponentLink3Description: Package Specification; ComponentLink3URL: http://www.samtec.com/documents/webfiles/cpdf/CLT-1XX-02-XX-D-XX-MKT.pdf
footprint SMTC-CLT-126-02-X-D (Low Profile Socket Strip, 2x26 Pins, Vertical, 2mm Pitch, Female)
pins: 1, 2, 3, 4, 5, 6, 7, 8, 9, 10, 11, 12, 13, 14, 15, 16, 17, 18, 19, 20, 21, 22, 23, 24, 25, 26, 27, 28, 29, 30, 31, 32, 33, 34, 35, 36, 37, 38, 39, 40, 41, 42, 43, 44, 45, 46, 47, 48, 49, 50, 51, 52
